# Altium footprint library Lib_001.PcbLib: 429 footprints (part 16 of 28)
Each footprint in its own frame and in the unit in brackets; x right, y up, seen from the top. Pads: shape width x height; smd on the part's side, far side on the other; paste and mask are expansions set on the pad; w line width, h text height; cw(c..) or ccw(c..) is an arc to the next point about the centre after c.
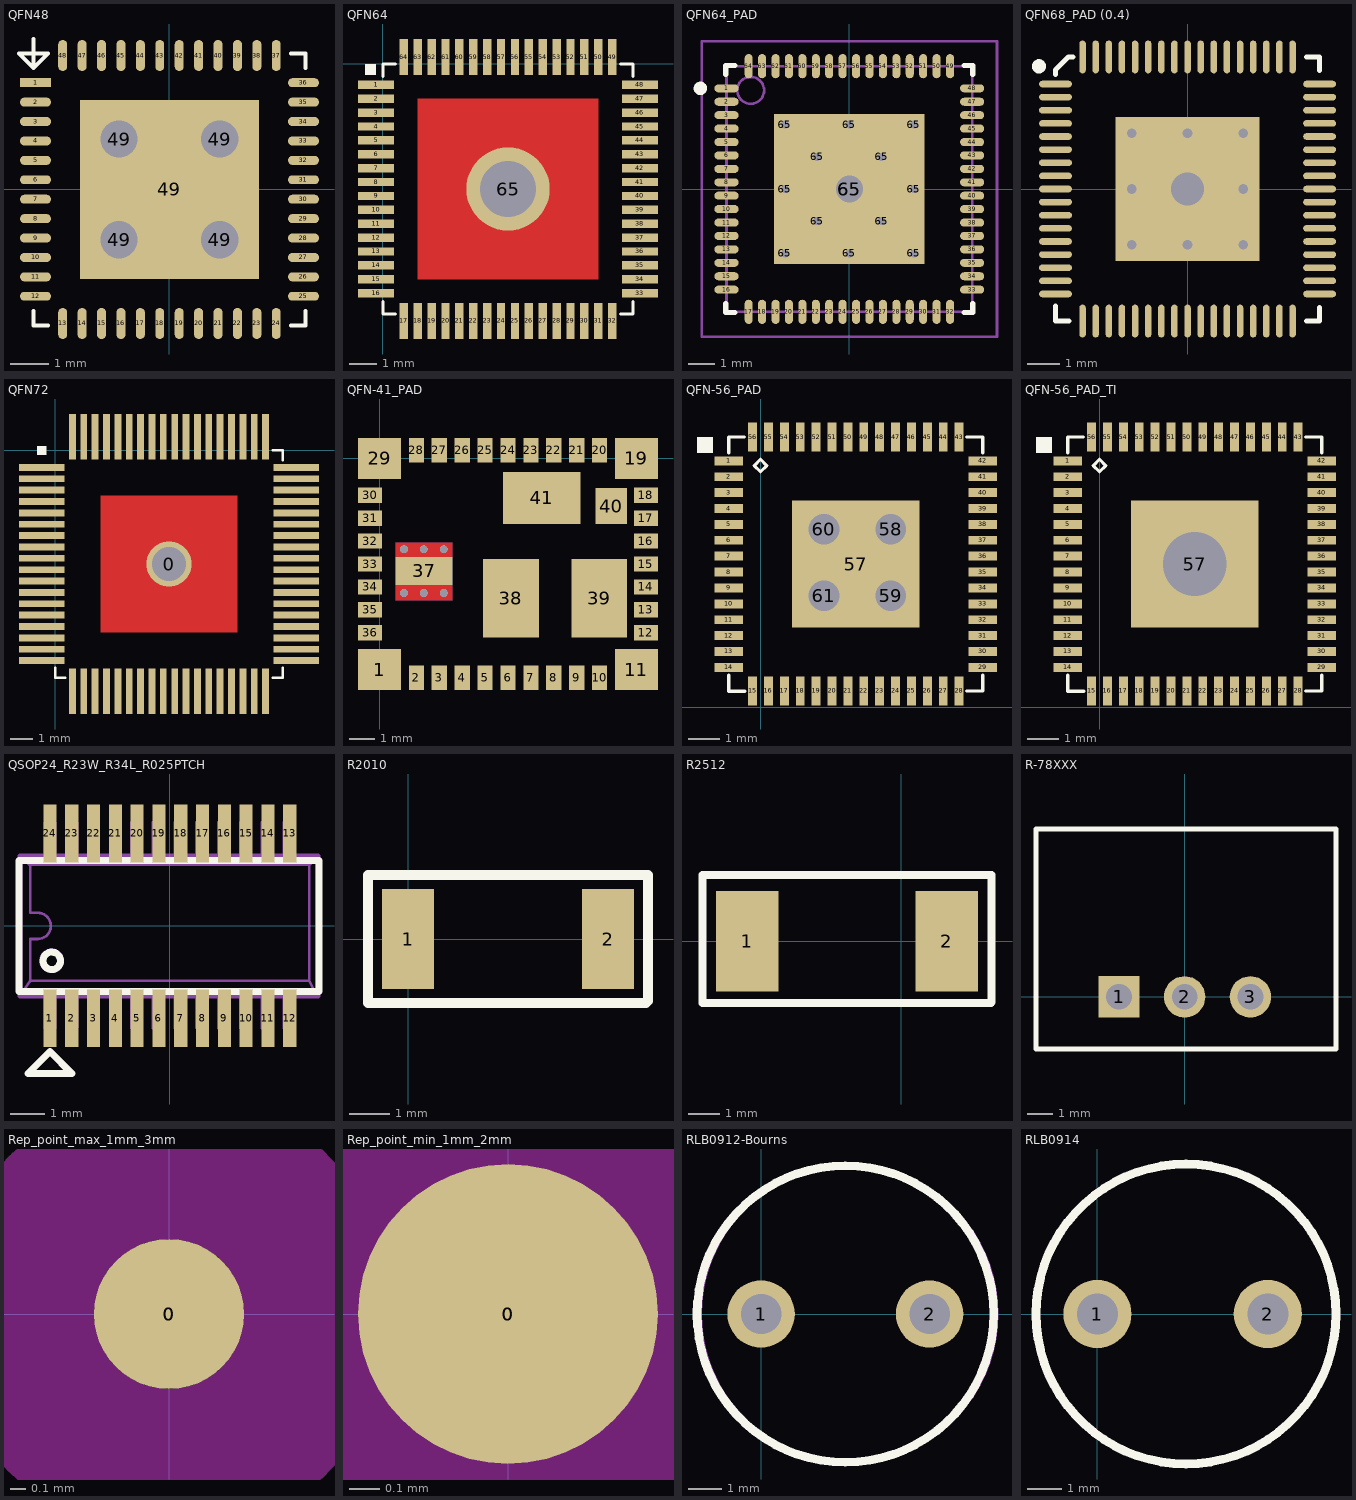
[diagram p15: the footprints below, top view; thin cyan lines are the x and y axes]

## QFN48 [mm]
pads (53):
  rect 0.8x0.23 smd: 1(-3.45,2.75)
  oval 0.8x0.23 smd: 2(-3.45,2.25) 3(-3.45,1.75) 4(-3.45,1.25) 5(-3.45,0.75) 6(-3.45,0.25) 7(-3.45,-0.25) 8(-3.45,-0.75) 9(-3.45,-1.25) 10(-3.45,-1.75) 11(-3.45,-2.25) 12(-3.45,-2.75) 25(3.45,-2.75) 26(3.45,-2.25) 27(3.45,-1.75) 28(3.45,-1.25) 29(3.45,-0.75) 30(3.45,-0.25) 31(3.45,0.25) 32(3.45,0.75) 33(3.45,1.25) 34(3.45,1.75) 35(3.45,2.25) 36(3.45,2.75)
  oval 0.23x0.8 smd: 13(-2.75,-3.45) 14(-2.25,-3.45) 15(-1.75,-3.45) 16(-1.25,-3.45) 17(-0.75,-3.45) 18(-0.25,-3.45) 19(0.25,-3.45) 20(0.75,-3.45) 21(1.25,-3.45) 22(1.75,-3.45) 23(2.25,-3.45) 24(2.75,-3.45) 37(2.75,3.45) 38(2.25,3.45) 39(1.75,3.45) 40(1.25,3.45) 41(0.75,3.45) 42(0.25,3.45) 43(-0.25,3.45) 44(-0.75,3.45) 45(-1.25,3.45) 46(-1.75,3.45) 47(-2.25,3.45) 48(-2.75,3.45)
  rect 1.575x1.575 hole 0.965: 49(-1.3,-1.3) 49(-1.3,1.3) 49(1.3,-1.3) 49(1.3,1.3)
  rect 4.6x4.6 smd: 49(0,0)
Top Overlay:
  lines w0.1: -3.5,-3.125 -3.5,-3.5 -3.125,-3.5 ; -3.5,3.875 -3.5,3.5 ; 3.125,-3.5 3.5,-3.5 3.5,-3.125 ; 3.125,3.5 3.5,3.5 3.5,3.125 ; -3.5,3.125 -3.125,3.5 -3.5,3.5 ; -3.5,3.125 -3.875,3.5 -3.5,3.5 ; -3.5,3.125 -3.5,3.5
3D body "User Library-QFN48_7x7.STEP": height 0.78, standoff -0.02, extent -3.5,-3.5 3.52,3.52

## QFN64 [mm] "QFN64 Analog Devices"
height 1
pads (65):
  rect 1.3x0.3 smd: 1(-0.25,-0.75) 2(-0.25,-1.25) 3(-0.25,-1.75) 4(-0.25,-2.25) 5(-0.25,-2.75) 6(-0.25,-3.25) 7(-0.25,-3.75) 8(-0.25,-4.25) 9(-0.25,-4.75) 10(-0.25,-5.25) 11(-0.25,-5.75) 12(-0.25,-6.25) 13(-0.25,-6.75) 14(-0.25,-7.25) 15(-0.25,-7.75) 16(-0.25,-8.25) 33(9.25,-8.25) 34(9.25,-7.75) 35(9.25,-7.25) 36(9.25,-6.75) 37(9.25,-6.25) 38(9.25,-5.75) 39(9.25,-5.25) 40(9.25,-4.75) 41(9.25,-4.25) 42(9.25,-3.75) 43(9.25,-3.25) 44(9.25,-2.75) 45(9.25,-2.25) 46(9.25,-1.75) 47(9.25,-1.25) 48(9.25,-0.75)
  rect 0.3x1.3 smd: 17(0.75,-9.25) 18(1.25,-9.25) 19(1.75,-9.25) 20(2.25,-9.25) 21(2.75,-9.25) 22(3.25,-9.25) 23(3.75,-9.25) 24(4.25,-9.25) 25(4.75,-9.25) 26(5.25,-9.25) 27(5.75,-9.25) 28(6.25,-9.25) 29(6.75,-9.25) 30(7.25,-9.25) 31(7.75,-9.25) 32(8.25,-9.25) 49(8.25,0.25) 50(7.75,0.25) 51(7.25,0.25) 52(6.75,0.25) 53(6.25,0.25) 54(5.75,0.25) 55(5.25,0.25) 56(4.75,0.25) 57(4.25,0.25) 58(3.75,0.25) 59(3.25,0.25) 60(2.75,0.25) 61(2.25,0.25) 62(1.75,0.25) 63(1.25,0.25) 64(0.75,0.25)
  round 3 hole 2: 65(4.5,-4.5)
Top Layer:
  rectangle: 1.25,-7.75 7.75,-1.25
Top Overlay:
  rectangle: -0.65,-0.4 -0.25,0
  lines w0.1: 0,-8.55 0,-9 0.45,-9 ; 0,-0.45 0,0 0.45,0 ; 8.55,-9 9,-9 9,-8.55 ; 8.55,0 9,0 9,-0.45
3D body: height 1, standoff 0, extent 0,-9 9,0

## QFN64_PAD [mm] "64-Pin Quad Flat No-Lead 0.5 mm Pitch, IPC Low Density"
height 1
pads (78):
  oval 0.9x0.3 smd: 1(-4.575,3.75) 2(-4.575,3.25) 3(-4.575,2.75) 4(-4.575,2.25) 5(-4.575,1.75) 6(-4.575,1.25) 7(-4.575,0.75) 8(-4.575,0.25) 9(-4.575,-0.25) 10(-4.575,-0.75) 11(-4.575,-1.25) 12(-4.575,-1.75) 13(-4.575,-2.25) 14(-4.575,-2.75) 15(-4.575,-3.25) 16(-4.575,-3.75) 33(4.575,-3.75) 34(4.575,-3.25) 35(4.575,-2.75) 36(4.575,-2.25) 37(4.575,-1.75) 38(4.575,-1.25) 39(4.575,-0.75) 40(4.575,-0.25) 41(4.575,0.25) 42(4.575,0.75) 43(4.575,1.25) 44(4.575,1.75) 45(4.575,2.25) 46(4.575,2.75) 47(4.575,3.25) 48(4.575,3.75)
  oval 0.3x0.9 smd: 17(-3.75,-4.575) 18(-3.25,-4.575) 19(-2.75,-4.575) 20(-2.25,-4.575) 21(-1.75,-4.575) 22(-1.25,-4.575) 23(-0.75,-4.575) 24(-0.25,-4.575) 25(0.25,-4.575) 26(0.75,-4.575) 27(1.25,-4.575) 28(1.75,-4.575) 29(2.25,-4.575) 30(2.75,-4.575) 31(3.25,-4.575) 32(3.75,-4.575) 49(3.75,4.575) 50(3.25,4.575) 51(2.75,4.575) 52(2.25,4.575) 53(1.75,4.575) 54(1.25,4.575) 55(0.75,4.575) 56(0.25,4.575) 57(-0.25,4.575) 58(-0.75,4.575) 59(-1.25,4.575) 60(-1.75,4.575) 61(-2.25,4.575) 62(-2.75,4.575) 63(-3.25,4.575) 64(-3.75,4.575)
  round 0.6 hole 0.3 unplated: 65(-2.4,-2.4) 65(-2.4,0) 65(-2.4,2.4) 65(-1.2,-1.2) 65(-1.2,1.2) 65(0,-2.4) 65(0,2.4) 65(1.2,-1.2) 65(1.2,1.2) 65(2.4,-2.4) 65(2.4,0) 65(2.4,2.4)
  rect 5.6x5.6 smd: 65(0,0)
  round 1.5 hole 1 unplated: 65(0,0)
Top Overlay:
  circle w0.25: c-5.55,3.75 r0.125
  lines w0.2: -4.6,-4.275 -4.6,-4.6 -4.275,-4.6 ; -4.6,4.275 -4.6,4.6 -4.275,4.6 ; 4.275,-4.6 4.6,-4.6 4.6,-4.275 ; 4.275,4.6 4.6,4.6 4.6,4.275
Mechanical 13:
  circle w0.1: c-3.675,3.675 r0.5
  lines w0.1: -4.575,-4.575 4.575,-4.575 4.575,4.575 -4.575,4.575 -4.575,-4.575
Mechanical 15:
  lines w0.1: -0.5,0 0.5,0 ; 0,-0.5 0,0.5 ; -5.5,-5.5 5.5,-5.5 5.5,5.5 -5.5,5.5 -5.5,-5.5
3D body "User Library-QFN64-2.step": height 0.9, standoff 0, extent -4.52,-4.52 4.52,4.52

## QFN68_PAD (0.4) [mm]
pads (70):
  oval 1x0.2 smd: 1(-4.025,3.2) 2(-4.025,2.8) 3(-4.025,2.4) 4(-4.025,2) 5(-4.025,1.6) 6(-4.025,1.2) 7(-4.025,0.8) 8(-4.025,0.4) 9(-4.025,0) 10(-4.025,-0.4) 11(-4.025,-0.8) 12(-4.025,-1.2) 13(-4.025,-1.6) 14(-4.025,-2) 15(-4.025,-2.4) 16(-4.025,-2.8) 17(-4.025,-3.2) 35(4.025,-3.2) 36(4.025,-2.8) 37(4.025,-2.4) 38(4.025,-2) 39(4.025,-1.6) 40(4.025,-1.2) 41(4.025,-0.8) 42(4.025,-0.4) 43(4.025,0) 44(4.025,0.4) 45(4.025,0.8) 46(4.025,1.2) 47(4.025,1.6) 48(4.025,2) 49(4.025,2.4) 50(4.025,2.8) 51(4.025,3.2)
  oval 0.2x1 smd: 18(-3.2,-4.025) 19(-2.8,-4.025) 20(-2.4,-4.025) 21(-2,-4.025) 22(-1.6,-4.025) 23(-1.2,-4.025) 24(-0.8,-4.025) 25(-0.4,-4.025) 26(0,-4.025) 27(0.4,-4.025) 28(0.8,-4.025) 29(1.2,-4.025) 30(1.6,-4.025) 31(2,-4.025) 32(2.4,-4.025) 33(2.8,-4.025) 34(3.2,-4.025) 52(3.2,4.025) 53(2.8,4.025) 54(2.4,4.025) 55(2,4.025) 56(1.6,4.025) 57(1.2,4.025) 58(0.8,4.025) 59(0.4,4.025) 60(0,4.025) 61(-0.4,4.025) 62(-0.8,4.025) 63(-1.2,4.025) 64(-1.6,4.025) 65(-2,4.025) 66(-2.4,4.025) 67(-2.8,4.025) 68(-3.2,4.025)
  rect 4.4x4.4 smd: ""(0,0)
  round 1.5 hole 1: ""(0,0)
via 0,-1.7 diameter 0.6 hole 0.3
via -1.7,0 diameter 0.6 hole 0.3
via 0,1.7 diameter 0.6 hole 0.3
via 1.7,0 diameter 0.6 hole 0.3
via 1.7,-1.7 diameter 0.6 hole 0.3
via -1.7,-1.7 diameter 0.6 hole 0.3
via -1.7,1.7 diameter 0.6 hole 0.3
via 1.7,1.7 diameter 0.6 hole 0.3
Top Overlay:
  circle w0.254: c-4.53,3.74 r0.089
  lines w0.15: -4.025,-3.561 -4.025,-4.025 -3.617,-4.025 ; -4.025,3.493 -4.025,3.635 -3.635,4.025 -3.493,4.025 ; 3.617,-4.025 4.025,-4.025 4.025,-3.617 ; 3.617,4.025 4.025,4.025 4.025,3.617
3D body "User Library-QFN68(8x8mm).STEP": height -0.45, standoff -1.3, extent -4.02,-4.02 4.02,4.02

## QFN72 [mm]
height 1
pads (73):
  round 2 hole 1.5: 0(5,-5)
  rect 2x0.3 smd: 1(-0.6,-0.75) 2(-0.6,-1.25) 3(-0.6,-1.75) 4(-0.6,-2.25) 5(-0.6,-2.75) 6(-0.6,-3.25) 7(-0.6,-3.75) 8(-0.6,-4.25) 9(-0.6,-4.75) 10(-0.6,-5.25) 11(-0.6,-5.75) 12(-0.6,-6.25) 13(-0.6,-6.75) 14(-0.6,-7.25) 15(-0.6,-7.75) 16(-0.6,-8.25) 17(-0.6,-8.75) 18(-0.6,-9.25) 37(10.6,-9.25) 38(10.6,-8.75) 39(10.6,-8.25) 40(10.6,-7.75) 41(10.6,-7.25) 42(10.6,-6.75) 43(10.6,-6.25) 44(10.6,-5.75) 45(10.6,-5.25) 46(10.6,-4.75) 47(10.6,-4.25) 48(10.6,-3.75) 49(10.6,-3.25) 50(10.6,-2.75) 51(10.6,-2.25) 52(10.6,-1.75) 53(10.6,-1.25) 54(10.6,-0.75)
  rect 0.3x2 smd: 19(0.75,-10.6) 20(1.25,-10.6) 21(1.75,-10.6) 22(2.25,-10.6) 23(2.75,-10.6) 24(3.25,-10.6) 25(3.75,-10.6) 26(4.25,-10.6) 27(4.75,-10.6) 28(5.25,-10.6) 29(5.75,-10.6) 30(6.25,-10.6) 31(6.75,-10.6) 32(7.25,-10.6) 33(7.75,-10.6) 34(8.25,-10.6) 35(8.75,-10.6) 36(9.25,-10.6) 55(9.25,0.6) 56(8.75,0.6) 57(8.25,0.6) 58(7.75,0.6) 59(7.25,0.6) 60(6.75,0.6) 61(6.25,0.6) 62(5.75,0.6) 63(5.25,0.6) 64(4.75,0.6) 65(4.25,0.6) 66(3.75,0.6) 67(3.25,0.6) 68(2.75,0.6) 69(2.25,0.6) 70(1.75,0.6) 71(1.25,0.6) 72(0.75,0.6)
Top Layer:
  region: 2,-2 8,-2 8,-8 2,-8
Top Overlay:
  rectangle: -0.8,-0.2 -0.4,0.2
  lines w0.1: 0,-9.55 0,-10 0.45,-10 ; 9.55,-10 10,-10 10,-9.55 ; 9.55,0 10,0 10,-0.45
3D body: height 0.2, standoff 0, extent 0,-10 10,0
3D body: height 1.2, standoff 0.2, extent 0,-10 10,0

## QFN-41_PAD [mm]
pads (41):
  rect 1.7x1.6 smd mask+0.07: 1(0,-8.3) 11(10.1,-8.3) 19(10.1,0) 29(0,0)
  rect 0.6x0.95 smd mask+0.07: 2(1.45,-8.625) 3(2.35,-8.625) 4(3.25,-8.625) 5(4.15,-8.625) 6(5.05,-8.625) 7(5.95,-8.625) 8(6.85,-8.625) 9(7.75,-8.625) 10(8.65,-8.625) 20(8.65,0.325) 21(7.75,0.325) 22(6.85,0.325) 23(5.95,0.325) 24(5.05,0.325) 25(4.15,0.325) 26(3.25,0.325) 27(2.35,0.325) 28(1.45,0.325)
  rect 0.95x0.6 smd mask+0.07: 12(10.475,-6.85) 13(10.475,-5.95) 14(10.475,-5.05) 15(10.475,-4.15) 16(10.475,-3.25) 17(10.475,-2.35) 18(10.475,-1.45) 30(-0.375,-1.45) 31(-0.375,-2.35) 32(-0.375,-3.25) 33(-0.375,-4.15) 34(-0.375,-5.05) 35(-0.375,-5.95) 36(-0.375,-6.85)
  rect 2.25x1.1 smd mask+0.07: 37(1.75,-4.42)
  rect 2.2x3.1 smd paste+0.07 mask+0.07: 38(5.16,-5.5) 39(8.64,-5.5)
  rect 1.24x1.4 smd mask+0.07: 40(9.11,-1.87)
  rect 3.05x2.04 smd mask+0.07: 41(6.37,-1.55)
via 2.518,-5.293 diameter 0.3 hole 0.3
via 1.738,-5.293 diameter 0.3 hole 0.3
via 0.958,-5.293 diameter 0.3 hole 0.3
via 2.518,-3.573 diameter 0.3 hole 0.3
via 1.738,-3.573 diameter 0.3 hole 0.3
via 0.958,-3.573 diameter 0.3 hole 0.3
Top Layer:
  rectangle: 0.625,-5.59 2.875,-4.97
  rectangle: 0.625,-3.87 2.875,-3.298
Bottom Layer:
  rectangle: 0.624,-5.59 2.875,-3.298

## QFN-56_PAD [mm]
pads (61):
  rect 0.9x0.279 smd: 1(-1,7.749) 2(-1,7.249) 3(-1,6.749) 4(-1,6.249) 5(-1,5.749) 6(-1,5.249) 7(-1,4.749) 8(-1,4.249) 9(-1,3.75) 10(-1,3.25) 11(-1,2.75) 12(-1,2.249) 13(-1,1.749) 14(-1,1.249) 29(6.993,1.249) 30(6.993,1.749) 31(6.993,2.249) 32(6.993,2.75) 33(6.993,3.25) 34(6.993,3.75) 35(6.993,4.249) 36(6.993,4.749) 37(6.993,5.249) 38(6.993,5.749) 39(6.993,6.249) 40(6.993,6.749) 41(6.993,7.249) 42(6.993,7.749)
  rect 0.279x0.9 smd: 15(-0.25,0.507) 16(0.25,0.507) 17(0.75,0.507) 18(1.25,0.507) 19(1.75,0.507) 20(2.25,0.507) 21(2.75,0.507) 22(3.25,0.507) 23(3.75,0.507) 24(4.25,0.507) 25(4.75,0.507) 26(5.25,0.507) 27(5.75,0.507) 28(6.25,0.507) 43(6.25,8.499) 44(5.75,8.499) 45(5.25,8.499) 46(4.75,8.499) 47(4.25,8.499) 48(3.75,8.499) 49(3.25,8.499) 50(2.75,8.499) 51(2.25,8.499) 52(1.75,8.499) 53(1.25,8.499) 54(0.75,8.499) 55(0.25,8.499) 56(-0.25,8.499)
  rect 4x4 smd: 57(2.996,4.503)
  rect 1.575x1.575 / inner round 1.575 / far side round 1.575 hole 0.965: 58(4.095,5.602) 59(4.095,3.504) 60(1.997,5.602) 61(1.997,3.504)
Top Overlay:
  rectangle: -2,8 -1.5,8.5
  lines w0.1: -1,0.5 -1,1 ; -1,8 -1,8.5 -0.5,8.5
  lines w0.102: -1,0.5 -0.5,0.5 ; 6.493,0.507 6.993,0.507 6.993,1.006 ; 6.493,8.499 6.993,8.499 6.993,8 ; -0.201,7.6 -0.001,7.8 0.199,7.6 -0.001,7.4 -0.201,7.6
3D body: height 1.2, standoff 0, extent -1,0.5 7,8.5

## QFN-56_PAD_TI [mm]
pads (58):
  rect 0.9x0.279 smd: 1(-1,7.749) 2(-1,7.249) 3(-1,6.749) 4(-1,6.249) 5(-1,5.749) 6(-1,5.249) 7(-1,4.749) 8(-1,4.249) 9(-1,3.75) 10(-1,3.25) 11(-1,2.75) 12(-1,2.249) 13(-1,1.749) 14(-1,1.249) 29(6.993,1.249) 30(6.993,1.749) 31(6.993,2.249) 32(6.993,2.75) 33(6.993,3.25) 34(6.993,3.75) 35(6.993,4.249) 36(6.993,4.749) 37(6.993,5.249) 38(6.993,5.749) 39(6.993,6.249) 40(6.993,6.749) 41(6.993,7.249) 42(6.993,7.749)
  rect 0.279x0.9 smd: 15(-0.25,0.507) 16(0.25,0.507) 17(0.75,0.507) 18(1.25,0.507) 19(1.75,0.507) 20(2.25,0.507) 21(2.75,0.507) 22(3.25,0.507) 23(3.75,0.507) 24(4.25,0.507) 25(4.75,0.507) 26(5.25,0.507) 27(5.75,0.507) 28(6.25,0.507) 43(6.25,8.499) 44(5.75,8.499) 45(5.25,8.499) 46(4.75,8.499) 47(4.25,8.499) 48(3.75,8.499) 49(3.25,8.499) 50(2.75,8.499) 51(2.25,8.499) 52(1.75,8.499) 53(1.25,8.499) 54(0.75,8.499) 55(0.25,8.499) 56(-0.25,8.499)
  rect 4x4 smd: 57(2.996,4.503)
  round 0 hole 2: 60(2.996,4.503)
Top Overlay:
  rectangle: -2,8 -1.5,8.5
  lines w0.1: -1,0.5 -1,1 ; -1,8 -1,8.5 -0.5,8.5
  lines w0.102: -1,0.5 -0.5,0.5 ; 6.493,0.507 6.993,0.507 6.993,1.006 ; 6.493,8.499 6.993,8.499 6.993,8 ; -0.201,7.6 -0.001,7.4 0.199,7.6 -0.001,7.8 -0.201,7.6
3D body: height 1.2, standoff 0, extent -1,0.5 7,8.5

## QSOP24_R23W_R34L_R025PTCH [mil]
pads (24):
  rect 15x66 smd: 1(-137.5,-106) 2(-112.5,-106) 3(-87.5,-106) 4(-62.5,-106) 5(-37.5,-106) 6(-12.5,-106) 7(12.5,-106) 8(37.5,-106) 9(62.5,-106) 10(87.5,-106) 11(112.5,-106) 12(137.5,-106) 13(137.5,106) 14(112.5,106) 15(87.5,106) 16(62.5,106) 17(37.5,106) 18(12.5,106) 19(-12.5,106) 20(-37.5,106) 21(-62.5,106) 22(-87.5,106) 23(-112.5,106) 24(-137.5,106)
Top Overlay:
  circle w8: c-135.5,-40 r10
  lines w8: -173,-75 -173,75 171,75 171,-75 -173,-75 ; -162.5,-169 -137.5,-144 -112.5,-169 -162.5,-169
Mechanical 1:
  circle w6: c-135.5,-40 r11.18
  lines w3: -172,-80 -143.5,-80 -143.5,-117 -131.5,-117 -131.5,-80 -118.5,-80 -118.5,-117 -106.5,-117 -106.5,-80 -93.5,-80 -93.5,-117 -81.5,-117 -81.5,-80 -68.5,-80 -68.5,-117 -56.5,-117 -56.5,-80 -44.5,-80 -44.5,-117 -32.5,-117 -32.5,-80 -19.5,-80 -19.5,-117 -7.5,-117 -7.5,-80 5.5,-80 5.5,-117 17.5,-117 17.5,-80 30.5,-80 30.5,-117 42.5,-117 42.5,-80 55.5,-80 55.5,-117 67.5,-117 67.5,-80 80.5,-80 80.5,-117 92.5,-117 92.5,-80 105.5,-80 105.5,-117 117.5,-117 117.5,-80 130.5,-80 130.5,-117 142.5,-117 142.5,-80 168.5,-80 ; -172,-80 -172,81 -160,69 -160,15 ; -172,-80 -160,-63 ; -172,-80 168.5,-80 ; -160,-63 -160,-15 ; -160,-63 160,-63 ; -160,-63 -160,-15 ; -160,-15 -151.5,-15 ; -160,-15 -151.5,-15 ; -160,15 -151.5,15 ; -160,15 -151.5,15 ; -160,15 -160,70 160,70 ; -151.5,-15 ccw(c-151.45,0) -151.5,15 ; -151.5,-15 ccw(c-151.45,0) -151.5,15 ; 160,-63 168.5,-80 ; 160,-63 160,70 ; 160,-63 168.5,-80 ; 160,70 170,80 142.5,80 142.5,119 130.5,119 130.5,80 117.5,80 117.5,119 105.5,119 105.5,80 92.5,80 92.5,119 80.5,119 80.5,80 67.5,80 67.5,119 55.5,119 55.5,80 42.5,80 42.5,119 30.5,119 30.5,80 17.5,80 17.5,119 5.5,119 5.5,80 -7.5,80 -7.5,119 -19.5,119 -19.5,80 -32.5,80 -32.5,119 -44.5,119 -44.5,80 -56.5,80 -56.5,119 -68.5,119 -68.5,80 -81.5,80 -81.5,119 -93.5,119 -93.5,80 -106.5,80 -106.5,119 -118.5,119 -118.5,80 -131.5,80 -131.5,119 -143.5,119 -143.5,80 -171,80 -161,70 160,70
  lines w6: -172,-80 -172,80 170,80 170,-80 -172,-80
Mechanical 3:
  text "JW" at -51,-31 h37.5
3D body "User Library-QSOP24.step": height 68.11, standoff 0, extent -196.65,-118.89 197.45,124.81

## R2010 [mm]
height 0.55
pads (2):
  rect 1.3x2.5 smd: 1(0,0) 2(5,0)
Top Overlay:
  lines w0.254: -1,-1.6 -1,1.6 6,1.6 6,-1.55 5.95,-1.6 -1,-1.6
3D body "User Library-res2010.STEP": height 0.62, standoff 0, extent -0.4,-1.43 5.6,1.27

## R2512 [mm] "Chip Resistor, Body 3.2x1.6mm, IPC Medium Density"
height 0.71
pads (2):
  rect 2x3.2 smd: 1(-4.9,0) 2(1.45,0)
Top Overlay:
  lines w0.254: -6.32,-1.96 2.86,-1.96 2.88,-1.94 2.88,2.1 -6.32,2.1 -6.32,-1.96
Mechanical 13:
  lines w0.1: 1.675,-0.875 1.675,0.875
Mechanical 15:
  lines w0.1: 2.35,-1.15 2.35,1.15

## R-78XXX [mm]
height 4.7
pads (3):
  rect 1.6x1.6 hole 1: 1(-2.54,0)
  round 1.6 hole 1: 2(0,0) 3(2.54,0)
Top Overlay:
  lines w0.2: -5.75,-2.02 5.85,-2.02 5.85,6.49 -5.75,6.49 -5.75,-2.02
3D body "R-78C-1.0.STEP": height 9.9, standoff -4.6, extent -5.75,-2.02 5.85,6.49

## Rep_point_max_1mm_3mm [mm]
pads (3):
  round 1 all layers, no hole: 0(0,0)
  round 1 smd: 0(0,0)
  round 1 on Bottom Solder: 0(0,0)
Top Solder:
  circle w1: c0,0 r1
Bottom Solder:
  circle w1: c0,0 r1
Keep-Out Layer:
  circle w1: c0,0 r1

## Rep_point_min_1mm_2mm [mm]
pads (3):
  round 1 all layers, no hole: 0(0,0)
  round 1 smd: 0(0,0)
  round 1 on Bottom Solder: 0(0,0)
Top Solder:
  circle w1: c0,0 r0.5
Bottom Solder:
  circle w1: c0,0 r0.5
Keep-Out Layer:
  circle w1: c0,0 r0.5

## RLB0912-Bourns [mm] "RLB0912-Bourns"
height 12
pads (2):
  round 2 hole 1.2: 1(0,0) 2(5,0)
Top Overlay:
  circle w0.254: c2.5,0 r4.4
Mechanical 1:
  circle w0.1: c2.6,0 r4.4
3D body: height 11.5, standoff 10, extent -1.845,-4.343 6.92,4.439
3D body: height 10, standoff 1.5, extent -0.902,-3.423 6.07,3.563
3D body: height 1.5, standoff 0, extent -1.845,-4.343 6.92,4.439
3D body: height 1.5, standoff -1.5, extent 4.544,-0.469 5.54,0.529
3D body: height 1.5, standoff -1.5, extent -0.496,-0.499 0.5,0.499

## RLB0914 [mm] "RLB1314 Inductor"
height 12
pads (2):
  round 2 hole 1.2: 1(0,0) 2(5,0)
Top Overlay:
  circle w0.254: c2.6,0 r4.4
Mechanical 1:
  circle w0.1: c2.6,0 r4.4
3D body: height 11.5, standoff 10, extent -1.845,-4.343 6.92,4.439
3D body: height 10, standoff 1.5, extent -0.902,-3.423 6.07,3.563
3D body: height 1.5, standoff 0, extent -1.845,-4.343 6.92,4.439
3D body: height 1.5, standoff -1.5, extent 4.544,-0.469 5.54,0.529
3D body: height 1.5, standoff -1.5, extent -0.496,-0.499 0.5,0.499